# Altium footprint library DrPCB.PcbLib: 910 footprints (part 45 of 57)
Each footprint in its own frame and in the unit in brackets; x right, y up, seen from the top. Pads: shape width x height; smd on the part's side, far side on the other; paste and mask are expansions set on the pad; w line width, h text height; cw(c..) or ccw(c..) is an arc to the next point about the centre after c.
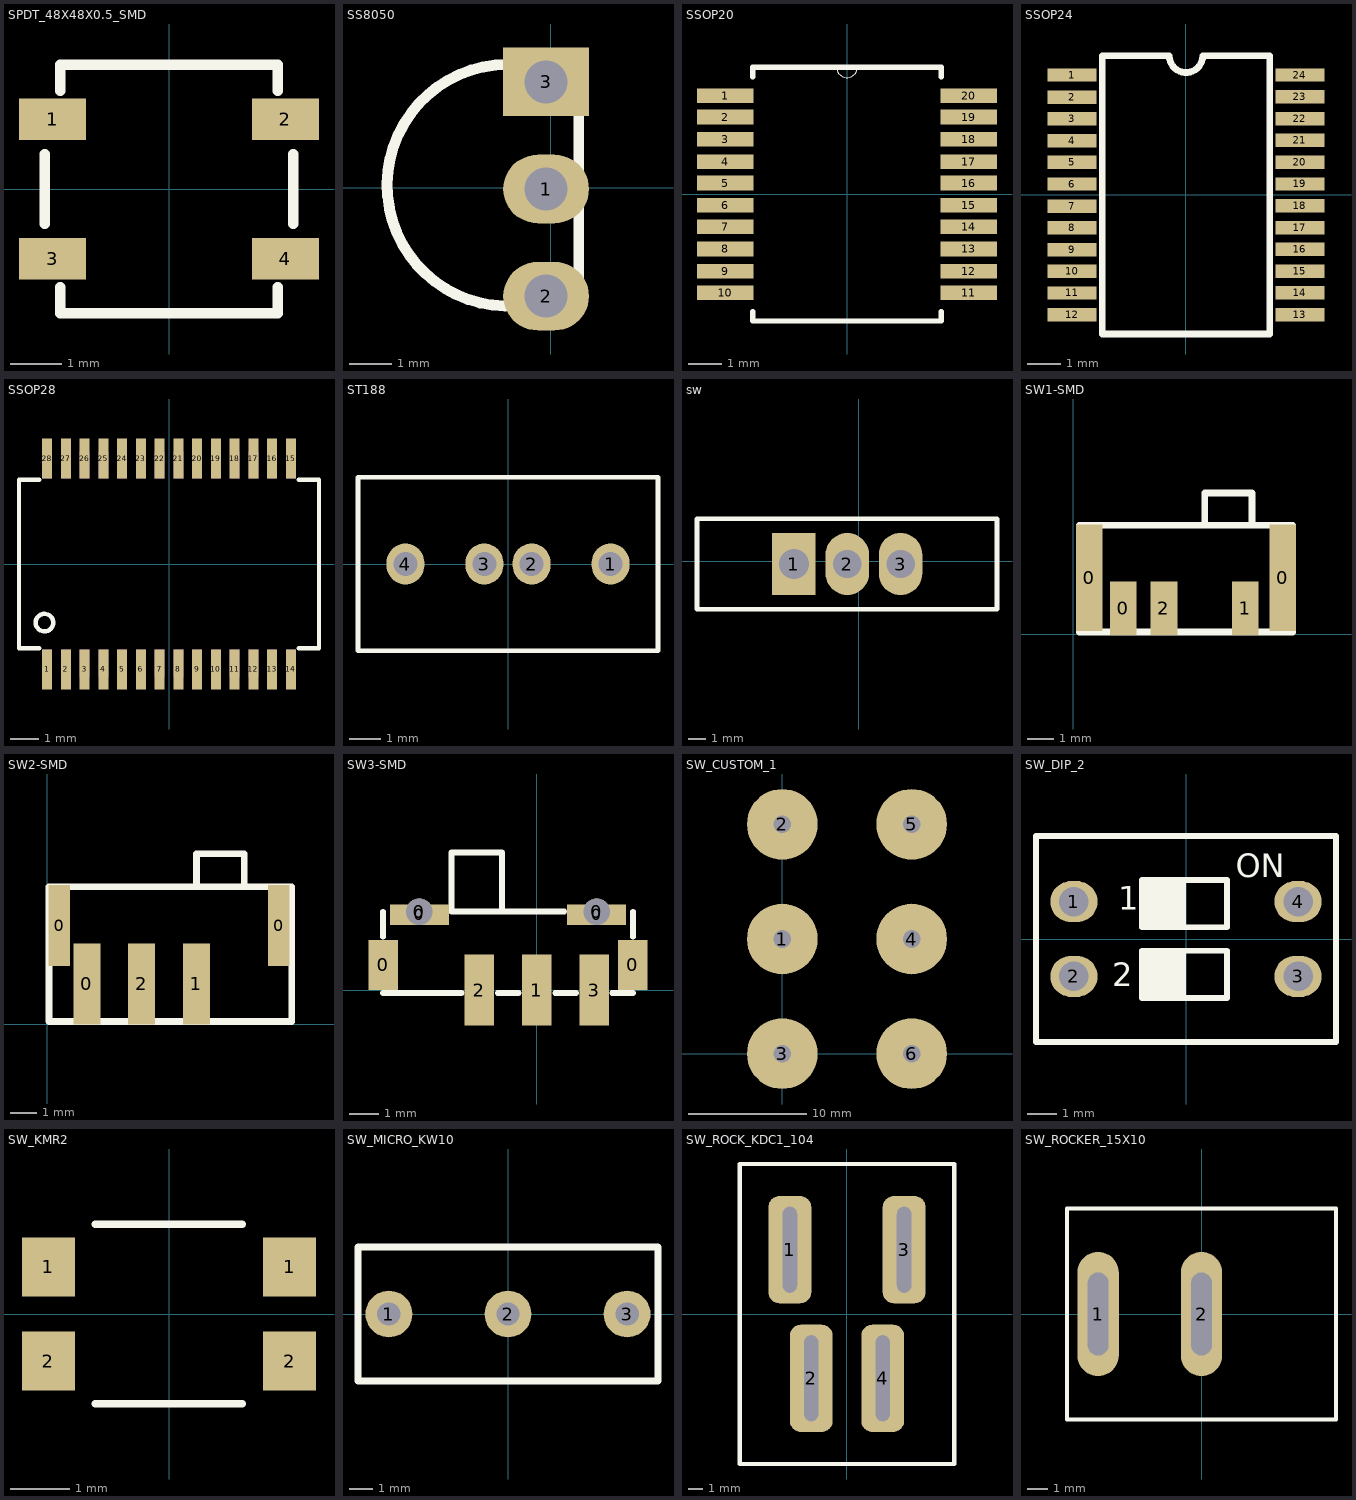
[diagram p44: the footprints below, top view; thin cyan lines are the x and y axes]

## SPDT_48X48X0.5_SMD [mm]
pads (4):
  rect 1.3x0.8 smd: 1(-2.25,1.35) 2(2.25,1.35) 3(-2.25,-1.346) 4(2.25,-1.346)
Top Overlay:
  lines w0.2: -2.4,-0.675 -2.4,0.675 ; -2.1,-1.9 -2.1,-2.4 2.1,-2.4 2.1,-1.9 ; -2.1,1.9 -2.1,2.4 2.1,2.4 2.1,1.9 ; 2.4,-0.675 2.4,0.675
3D body "ts-1197a-a.stp": height 0.55, standoff 0, extent -2.4,-2.4 2.4,2.4

## SS8050 [mm]
pads (3):
  oval 2x1.6 hole 1: 1(-0.109,-0.029) 2(-0.109,-2.529)
  rect 2x1.6 hole 1: 3(-0.109,2.471)
Top Overlay:
  lines w0.254: 0.59,-2.271 cw(c-0.998,0.058) 0.653,2.344 0.653,-2.228

## SSOP20 [mil]
pads (20):
  rect 66x17 smd: 1(-142,115) 2(-142,90) 3(-142,64) 4(-142,38) 5(-142,13) 6(-142,-13) 7(-142,-38) 8(-142,-64) 9(-142,-90) 10(-142,-115) 11(142,-115) 12(142,-90) 13(142,-64) 14(142,-38) 15(142,-13) 16(142,13) 17(142,38) 18(142,64) 19(142,90) 20(142,115)
Top Overlay:
  lines w0: -12,148 ccw(c0,148) 12,148
  lines w6: -110,-137 -110,-148 110,-148 110,-137 ; -110,137 -110,148 -12,148 12,148 110,148 110,137
3D body "PIC18F14K50-E_SS.step": height 79.59, standoff 0.5, extent -161.5,-147.48 161.5,147.48

## SSOP24 [mm]
pads (24):
  rect 1.45x0.4 smd: 1(-3.4,3.575) 2(-3.4,2.915) 3(-3.4,2.267) 4(-3.4,1.619) 5(-3.4,0.972) 6(-3.4,0.324) 7(-3.4,-0.337) 8(-3.4,-0.984) 9(-3.4,-1.632) 10(-3.4,-2.28) 11(-3.4,-2.927) 12(-3.4,-3.575) 13(3.4,-3.575) 14(3.4,-2.925) 15(3.4,-2.275) 16(3.4,-1.625) 17(3.4,-0.975) 18(3.4,-0.325) 19(3.4,0.325) 20(3.4,0.975) 21(3.4,1.625) 22(3.4,2.275) 23(3.4,2.925) 24(3.4,3.575)
Top Overlay:
  lines w0.2: -2.5,-4.15 2.5,-4.15 2.5,4.15 0.5,4.15 cw(c0,4.15) -0.5,4.15 -2.5,4.15 -2.5,-4.15

## SSOP28 [mm]
pads (28):
  rect 0.348x1.397 smd: 1(-4.225,-3.656) 2(-3.575,-3.656) 3(-2.925,-3.656) 4(-2.275,-3.656) 5(-1.625,-3.656) 6(-0.975,-3.656) 7(-0.325,-3.656) 8(0.325,-3.656) 9(0.975,-3.656) 10(1.625,-3.656) 11(2.275,-3.656) 12(2.925,-3.656) 13(3.575,-3.656) 14(4.225,-3.656) 15(4.225,3.656) 16(3.575,3.656) 17(2.925,3.656) 18(2.275,3.656) 19(1.625,3.656) 20(0.975,3.656) 21(0.325,3.656) 22(-0.325,3.656) 23(-0.975,3.656) 24(-1.625,3.656) 25(-2.275,3.656) 26(-2.925,3.656) 27(-3.575,3.656) 28(-4.225,3.656)
Top Overlay:
  circle w0.152: c-4.318,-2.032 r0.305
  lines w0.152: -5.2,-2.925 -4.496,-2.925 ; -5.2,2.925 -4.496,2.925 ; -5.2,-2.925 -5.2,2.925 ; 4.496,-2.925 5.2,-2.925 5.2,2.925 ; 4.496,2.925 5.2,2.925
Mechanical 4:
  drawing of 56 lines, arcs and shapes, not listed
3D body "User Library-SSOP-28-3.STEP": height 1.91, standoff 0.01, extent -5.1,-3.9 5.1,3.9

## ST188 [mm]
pads (4):
  oval 1.2x1.3 hole 0.762: 1(3.25,0) 2(0.75,0) 3(-0.75,0) 4(-3.25,0)
Top Overlay:
  lines w0.15: -4.75,-2.75 -4.75,2.75 4.75,2.75 4.75,-2.75 -4.75,-2.75
3D body "User Library-ST 188.step": height 8.21, standoff -15.04, extent -4.5,-2.5 4.5,2.5

## sw [mm]
pads (3):
  rect 2.45x3.5 hole 1.7: 1(-3.655,-0.164)
  oval 2.45x3.5 hole 1.6: 2(-0.655,-0.164) 3(2.345,-0.164)
Top Overlay:
  lines w0.254: -9.116,-2.704 7.775,-2.704 7.775,2.376 -9.116,2.376 -9.116,-2.704

## SW1-SMD [mm]
pads (5):
  rect 1x4 smd: 0(0.613,2.119) 0(7.852,2.119)
  rect 1x2 smd: 0(1.883,0.976) 1(6.455,0.976) 2(3.407,0.976)
Top Overlay:
  lines w0.254: 4.931,4.087 4.931,5.294 6.709,5.294 6.709,4.087 ; 0.232,0.087 0.232,4.087 8.232,4.087 8.232,0.087 0.232,0.087

## SW2-SMD [mm]
pads (5):
  rect 0.8x3 smd: 0(0.456,3.654) 0(8.584,3.654)
  rect 1x3 smd: 0(1.472,1.495) 1(5.536,1.495) 2(3.504,1.495)
Top Overlay:
  lines w0.254: 5.536,5.114 5.536,6.321 7.314,6.321 7.314,5.114 ; 9.075,5.051 9.075,0.098 0.075,0.098 0.075,5.098 9.075,5.098

## SW3-SMD [mm]
pads (9):
  rect 1x1.7 smd: 0(-5.2,0.85) 0(3.25,0.85)
  rect 2x0.7 smd: 0(-3.975,2.55) 0(2.025,2.55)
  round 0.9 hole 0.9: 0(-3.975,2.65) 0(2.025,2.65)
  rect 1x2.4 smd: 1(0,0) 2(-1.95,0) 3(1.95,0)
Top Overlay:
  lines w0.2: -5.2,-0.102 -2.553,-0.102 ; -5.2,1.803 -5.2,2.65 ; -1.321,-0.102 -0.622,-0.102 ; -1.183,2.654 -1.183,4.654 -2.883,4.654 -2.883,2.654 0.927,2.654 ; 0.622,-0.102 1.321,-0.102 ; 2.553,-0.102 3.251,-0.102 ; 3.25,1.803 3.25,2.65

## SW_CUSTOM_1 [mm]
pads (6):
  round 6 hole 1.5: 1(0,9.75) 2(0,19.5) 3(0,0) 4(11,9.75) 5(11,19.5) 6(11,0)
3D body "User Library-amp faston 42400.step": height 18.3, standoff 0.01, extent 7.19,-1.981 14.81,1.981
3D body "User Library-amp faston 42400.step": height 18.3, standoff 0.01, extent 7.19,7.769 14.81,11.731
3D body "User Library-amp faston 42400.step": height 18.3, standoff 0.01, extent 7.19,17.519 14.81,21.481
3D body "User Library-amp faston 42400.step": height 18.3, standoff 0.01, extent -3.81,-1.981 3.81,1.981
3D body "User Library-amp faston 42400.step": height 18.3, standoff 0.01, extent -3.81,17.519 3.81,21.481
3D body "User Library-amp faston 42400.step": height 18.3, standoff 0.01, extent -3.81,7.769 3.81,11.731

## SW_DIP_2 [mm] "SWITCH DIP 2POS, THD, 2.54mm, SD02"
height 6.5
pads (4):
  oval 1.6x1.4 / inner round 1.4 / far side oval 2.2x1.4 hole 1: 1(-3.81,1.27) 2(-3.81,-1.27) 3(3.81,-1.27) 4(3.81,1.27)
Top Overlay:
  rectangle: -1.5,-2 0,-0.4
  rectangle: -1.5,0.4 0,2
  lines w0.2: -5.1,-3.5 5.1,-3.5 5.1,3.5 -5.1,3.5 -5.1,-3.5 ; -1.5,-2 -1.5,-0.4 1.4,-0.4 1.4,-2 -1.5,-2 ; -1.5,0.4 -1.5,2 1.4,2 1.4,0.4 -1.5,0.4
  text "ON" at 1.7,2.1 h0.8
  text "1" at -2.3,1 h0.8
  text "2" at -2.5,-1.6 h0.8
3D body "SSGM120100.STEP": height 5, standoff -3, extent -4.704,-3.45 4.704,3.45

## SW_KMR2 [mm]
pads (4):
  rect 0.9x1 smd: 1(-2.05,0.8) 1(2.05,0.8) 2(-2.05,-0.8) 2(2.05,-0.8)
Top Overlay:
  lines w0.127: -1.255,-1.524 1.245,-1.524 ; -1.255,1.524 1.245,1.524
3D body "User Library-Switch-CK-KMR2.STEP": height 2.1, standoff 0, extent -2.3,-1.5 2.3,1.5

## SW_MICRO_KW10 [mm]
pads (3):
  round 2 hole 1: 1(-5.08,0) 2(0,0) 3(5.08,0)
Top Overlay:
  lines w0.3: -6.4,-2.85 6.4,-2.85 6.4,2.85 -6.4,2.85 -6.4,-2.85
3D body "User Library-KW10-Z1P.step": height 9.9, standoff -3, extent -6.3,-2.85 6.3,2.85

## SW_ROCK_KDC1_104 [mm]
pads (4):
  rrect50% 3x7.5 hole 1 slot 6 at 90 deg: 1(-4,4.5) 2(-2.5,-4.5) 3(4,4.5) 4(2.5,-4.5)
Top Overlay:
  lines w0.3: -7.5,-10.5 7.5,-10.5 7.5,10.5 -7.5,10.5 -7.5,-10.5
3D body "Rocker Switch KCD1-104.STEP": height 21.34, standoff -7.49, extent -7.5,-10.771 7.5,10.771

## SW_ROCKER_15X10 [mm] "SWITCH Rocker, SPST, Straight, 15x10"
pads (2):
  oval 2x6 hole 1 slot 4 at 90 deg: 1(-5,0) 2(0,0)
Top Overlay:
  lines w0.2: -6.5,-5.1 6.5,-5.1 6.5,5.1 -6.5,5.1 -6.5,-5.1
3D body "KCD1-11-3P-Off.step": height 13.1, standoff -5.6, extent -7.6,-5.25 7.6,5.25